# Altium footprint library Converter.PcbLib: 3 footprints
Each footprint in its own frame and in the unit in brackets; x right, y up, seen from the top. Pads: shape width x height; smd on the part's side, far side on the other; paste and mask are expansions set on the pad; w line width, h text height; cw(c..) or ccw(c..) is an arc to the next point about the centre after c.
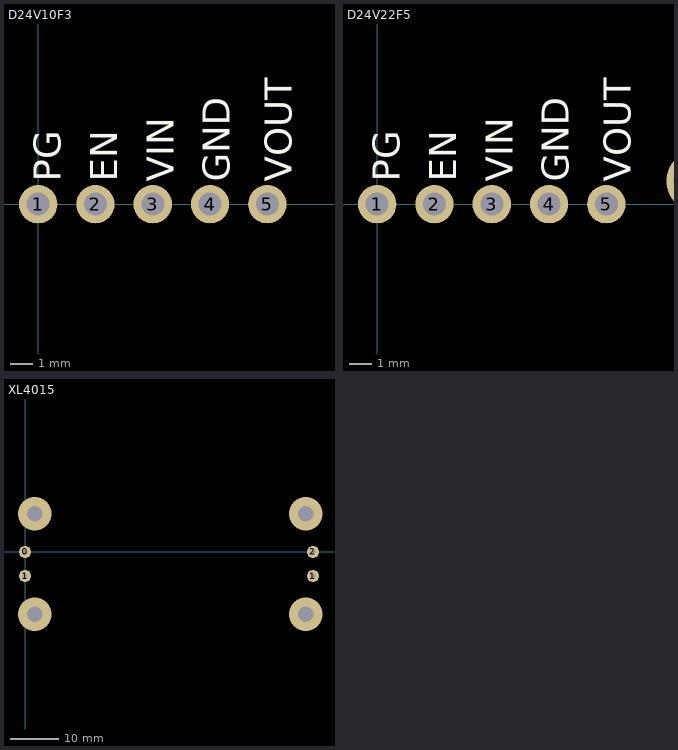
[diagram p0: the footprints below, top view; thin cyan lines are the x and y axes]

## D24V10F3 [mm]
pads (5):
  round 1.7 hole 1.02: 1(0,0) 2(2.54,0) 3(5.08,0) 4(7.62,0) 5(10.16,0)
Top Overlay:
  text "VOUT" at 11.25,1 h1.2
  text "GND" at 8.5,1 h1.2
  text "VIN" at 6,1 h1.2
  text "EN" at 3.5,1 h1.2
  text "PG" at 1,1 h1.2
3D body "pololu-1a-step-down-voltage-regulator-d24v10fx.step": height 3.82, standoff 0, extent -1.3,-1.25 11.4,16.53

## D24V22F5 [mm]
pads (5):
  round 1.7 hole 1.02: 1(0,0) 2(2.54,0) 3(5.08,0) 4(7.62,0) 5(10.16,0)
via 14.23,1.03 diameter 2.8 hole 2.18
via 1.03,14.23 diameter 2.8 hole 2.18
Top Overlay:
  text "VOUT" at 11.25,1 h1.2
  text "GND" at 8.5,1 h1.2
  text "VIN" at 6,1 h1.2
  text "EN" at 3.5,1 h1.2
  text "PG" at 1,1 h1.2
3D body "d24v22fx-step-down-voltage-regulator.step": height 7.12, standoff -1.1, extent -1.265,-1.225 16.515,16.555

## XL4015 [mm]
pads (4):
  round 2.5 hole 1: 0(0,0) 1(0,-5) 1(60,-5) 2(60,0)
via 2,8 diameter 7 hole 3.2
via 58.5,8 diameter 7 hole 3.2
via 58.5,-13 diameter 7 hole 3.2
via 2,-13 diameter 7 hole 3.2
3D body "XL4015.STEP": height 21.57, standoff 3.7, extent -0.751,-15.659 60.949,10.541